# Altium schematic symbol library IC_TI.SCHLIB: 1162 symbols (part 6 of 8) (continued)
## TL082ACP (continued)
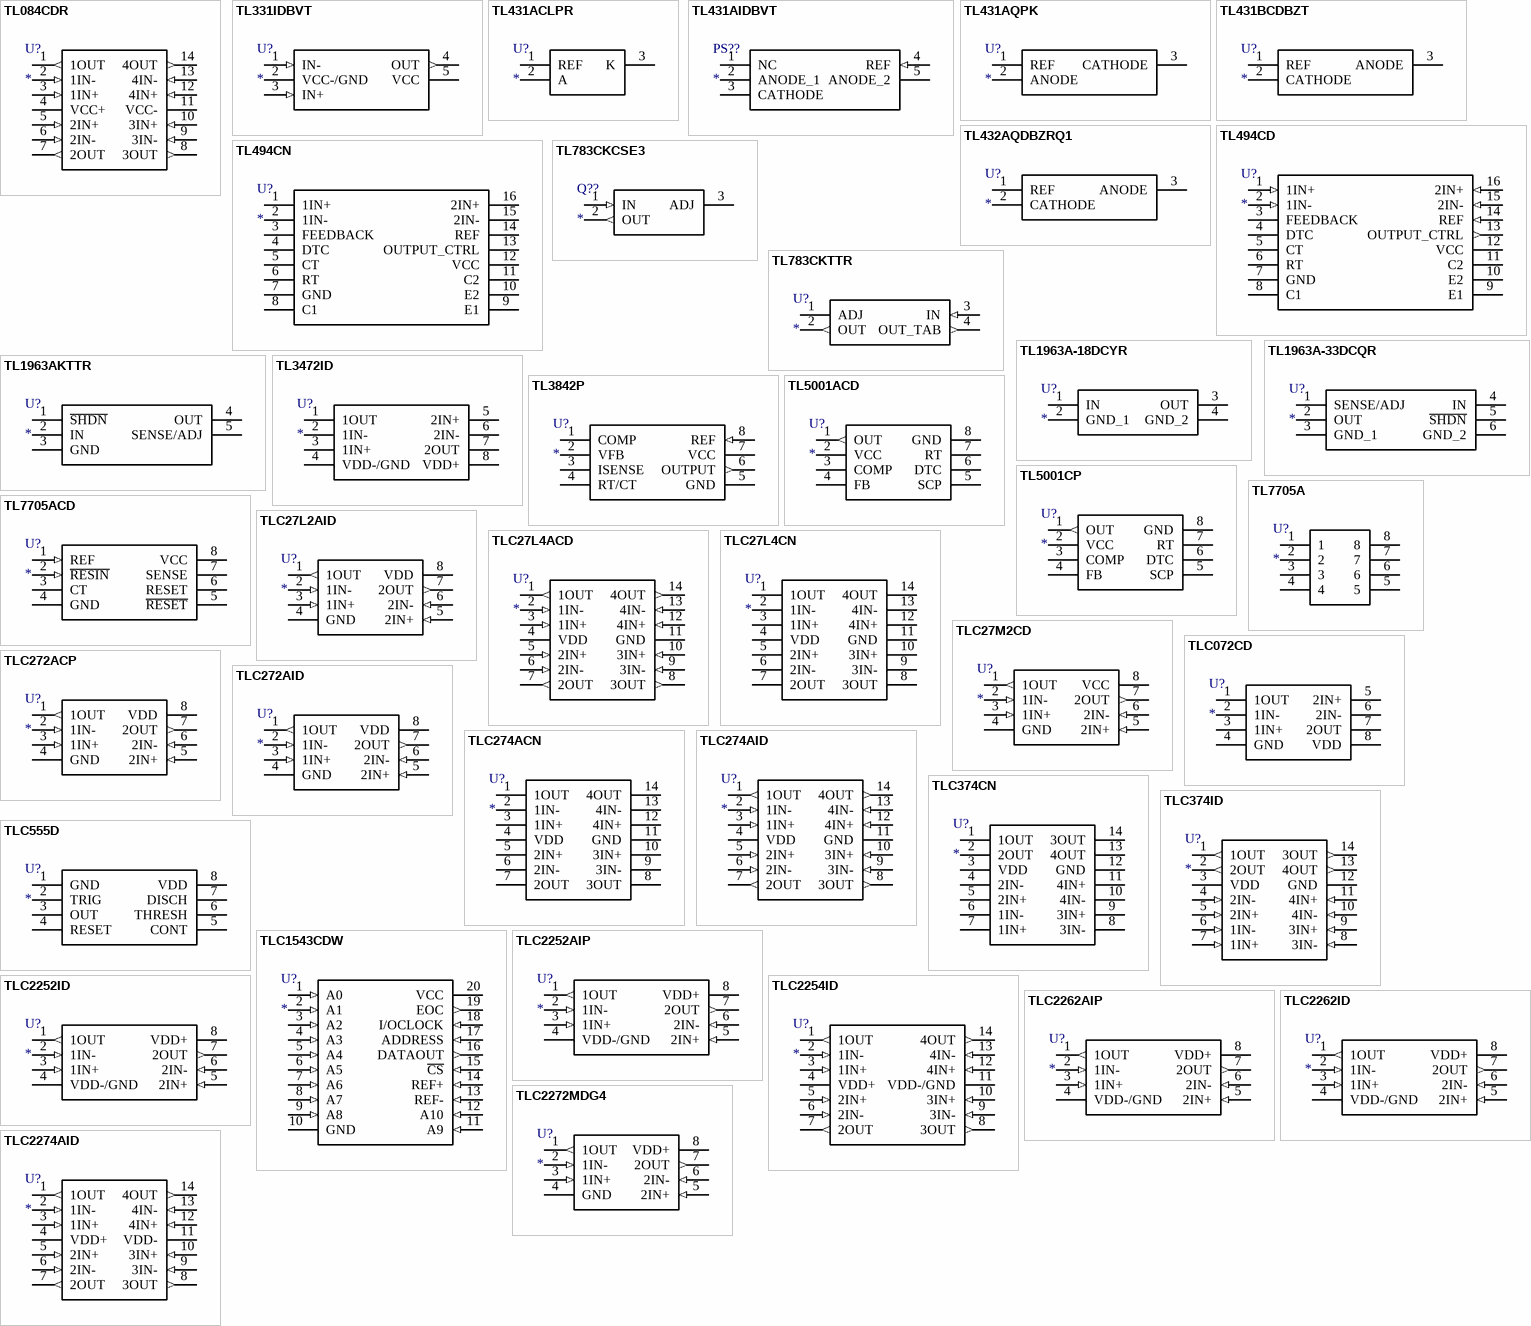
[diagram p26: symbols TL084CDR to TLC2274AID]

## TL084CDR
designator U?
Integrated Circuit; Manufacturer_Name: Texas Instruments; Manufacturer_Part_Number: TL084CDR; Datasheet Link: http://www.ti.com/lit/ds/symlink/tl084.pdf; Height: 1.75mm; Mouser Part Number: 595-TL084CDR; Mouser Price/Stock: https://www.mouser.com/Search/Refine.aspx?Keyword=595-TL084CDR; RS Part Number: 1788945; RS Price/Stock: http://uk.rs-online.com/web/p/products/1788945
footprint SOIC14_1.27
pins: 1 1OUT (out), 2 1IN- (in), 3 1IN+ (in), 4 VCC+ (power), 5 2IN+ (in), 6 2IN- (in), 7 2OUT (out), 8 3OUT (out), 9 3IN- (in), 10 3IN+ (in), 11 VCC- (power), 12 4IN+ (in), 13 4IN- (in), 14 4OUT (out)

## TL331IDBVT
designator U?
Integrated Circuit; Manufacturer_Name: Texas Instruments; Manufacturer_Part_Number: TL331IDBVT; Datasheet Link: http://www.ti.com/lit/ds/symlink/tl331.pdf; Height: 1.45mm; Mouser Part Number: 595-TL331IDBVT; Mouser Price/Stock: https://www.mouser.com/Search/Refine.aspx?Keyword=595-TL331IDBVT; RS Part Number: 6607446; RS Price/Stock: http://uk.rs-online.com/web/p/products/6607446
footprint SOT23-5 (SOT23, 5-Leads, Body 3.0x3.0mm (max), Pitch 0.95mm, IPC Medium Density)
pins: 1 IN- (in), 2 VCC-/GND (power), 3 IN+ (in), 4 OUT (out), 5 VCC (power)

## TL431ACLPR
designator U?
Integrated Circuit; Manufacturer_Name: Texas Instruments; Manufacturer_Part_Number: TL431ACLPR; Datasheet Link: http://www.ti.com/lit/gpn/tl431; Height: 5.34mm; Mouser Part Number: 595-TL431ACLPR; Mouser Price/Stock: https://www.mouser.com/Search/Refine.aspx?Keyword=595-TL431ACLPR; RS Part Number: 1686332; RS Price/Stock: http://uk.rs-online.com/web/p/products/1686332
footprint TO92 Bent
pins: 1 REF, 2 A, 3 K

## TL431AIDBVT
designator PS??
Power Supply; Manufacturer_Name: Texas Instruments; Manufacturer_Part_Number: TL431AIDBVT; Datasheet Link: http://www.ti.com/lit/gpn/tl431a; Height: 1.45mm; Mouser Part Number: 595-TL431AIDBVT; Mouser Price/Stock: https://www.mouser.com/Search/Refine.aspx?Keyword=595-TL431AIDBVT; RS Part Number: 6619515P; RS Price/Stock: http://uk.rs-online.com/web/p/products/6619515P
footprint SOT23-5 (SOT23, 5-Leads, Body 3.0x3.0mm (max), Pitch 0.95mm, IPC Medium Density)
pins: 1 NC, 2 ANODE_1 (power), 3 CATHODE (power), 4 REF (in), 5 ANODE_2 (power)

## TL431AQPK
designator U?
Integrated Circuit; Manufacturer_Name: Texas Instruments; Manufacturer_Part_Number: TL431AQPK; Datasheet Link: http://www.ti.com/lit/gpn/tl431a; Mouser Part Number: 595-TL431AQPK; Mouser Price/Stock: https://www.mouser.com/Search/Refine.aspx?Keyword=595-TL431AQPK
footprint sot89
pins: 1 REF, 2 ANODE, 3 CATHODE

## TL431BCDBZT
designator U?
Integrated Circuit; Manufacturer_Name: Texas Instruments; Manufacturer_Part_Number: TL431BCDBZT; Datasheet Link: http://www.ti.com/lit/ds/symlink/tl431b.pdf; Height: 1.12mm; Mouser Part Number: 595-TL431BCDBZT; Mouser Price/Stock: https://www.mouser.com/Search/Refine.aspx?Keyword=595-TL431BCDBZT; RS Part Number: 1456891; RS Price/Stock: http://uk.rs-online.com/web/p/products/1456891
footprint SOT23-3 (贴片MOS的SOT-23封装)
pins: 1 REF, 2 CATHODE, 3 ANODE

## TL432AQDBZRQ1
designator U?
Integrated Circuit; Manufacturer_Name: Texas Instruments; Manufacturer_Part_Number: TL432AQDBZRQ1; Datasheet Link: http://componentsearchengine.com/Datasheets/1/TL432AQDBZRQ1.pdf; Mouser Part Number: 595-TL432AQDBZRQ1; Mouser Price/Stock: https://www.mouser.com/Search/Refine.aspx?Keyword=595-TL432AQDBZRQ1
footprint SOT23-3 (贴片MOS的SOT-23封装)
pins: 1 REF, 2 CATHODE, 3 ANODE

## TL494CD
designator U?
Integrated Circuit; Manufacturer_Name: Texas Instruments; Manufacturer_Part_Number: TL494CD; Datasheet Link: http://www.ti.com/lit/ds/symlink/tl494.pdf; Height: 1.75mm; Mouser Part Number: 595-TL494CD; Mouser Price/Stock: https://www.mouser.com/Search/Refine.aspx?Keyword=595-TL494CD; RS Part Number: 6614958P; RS Price/Stock: http://uk.rs-online.com/web/p/products/6614958P
footprint SOIC16_1.27
pins: 1 1IN+ (in), 2 1IN- (in), 3 FEEDBACK, 4 DTC, 5 CT, 6 RT, 7 GND (power), 8 C1, 9 E1, 10 E2, 11 C2, 12 VCC (power), 13 OUTPUT_CTRL (out), 14 REF (in), 15 2IN- (in), 16 2IN+ (in)

## TL494CN
designator U?
Integrated Circuit; Manufacturer_Name: Texas Instruments; Manufacturer_Part_Number: TL494CN; Datasheet Link: http://www.ti.com/lit/gpn/tl494; Mouser Part Number: 595-TL494CN; Mouser Price/Stock: https://www.mouser.com/Search/Refine.aspx?Keyword=595-TL494CN; RS Part Number: 0528123; RS Price/Stock: http://uk.rs-online.com/web/p/products/0528123
footprint DIP16
pins: 1 1IN+, 2 1IN-, 3 FEEDBACK, 4 DTC, 5 CT, 6 RT, 7 GND, 8 C1, 9 E1, 10 E2, 11 C2, 12 VCC, 13 OUTPUT_CTRL, 14 REF, 15 2IN-, 16 2IN+

## TL783CKCSE3
designator Q??
Transistor; Manufacturer_Name: Texas Instruments; Manufacturer_Part_Number: TL783CKCSE3; Datasheet Link: http://uk.rs-online.com/web/p/products/6616232; Height: 4.7mm; Mouser Part Number: 595-TL783CKCSE3; Mouser Price/Stock: https://www.mouser.com/Search/Refine.aspx?Keyword=595-TL783CKCSE3; RS Part Number: 9223508; RS Price/Stock: http://uk.rs-online.com/web/p/products/9223508
footprint TO220-3
pins: 1 IN (in), 2 OUT (out), 3 ADJ

## TL783CKTTR
designator U?
Integrated Circuit; Manufacturer_Name: Texas Instruments; Manufacturer_Part_Number: TL783CKTTR; Datasheet Link: http://www.ti.com/lit/ds/symlink/tl783.pdf; Height: 4.83mm; Mouser Part Number: 595-TL783CKTTR; Mouser Price/Stock: https://www.mouser.com/Search/Refine.aspx?Keyword=595-TL783CKTTR; RS Part Number: 1219058; RS Price/Stock: http://uk.rs-online.com/web/p/products/1219058
footprint TO263-3
pins: 1 ADJ, 2 OUT (out), 3 IN (in), 4 OUT_TAB (out)

## TL1963A-18DCYR
designator U?
Integrated Circuit; Manufacturer_Name: Texas Instruments; Manufacturer_Part_Number: TL1963A-18DCYR; Datasheet Link: http://www.ti.com/lit/gpn/tl1963a; Height: 1.8mm; Mouser Part Number: 595-TL1963A-18DCYR; Mouser Price/Stock: https://www.mouser.com/Search/Refine.aspx?Keyword=595-TL1963A-18DCYR
footprint SOT223
pins: 1 IN, 2 GND_1, 3 OUT, 4 GND_2

## TL1963A-33DCQR
designator U?
Integrated Circuit; Manufacturer_Name: Texas Instruments; Manufacturer_Part_Number: TL1963A-33DCQR; Datasheet Link: http://www.ti.com/lit/gpn/tl1963a; Height: 1.8mm; Mouser Part Number: 595-TL1963A-33DCQR; Mouser Price/Stock: https://www.mouser.com/Search/Refine.aspx?Keyword=595-TL1963A-33DCQR
footprint SOT223-6
pins: 1 SENSE/ADJ, 2 OUT, 3 GND_1, 4 IN, 5 ~{SHDN}, 6 GND_2

## TL1963AKTTR
designator U?
Integrated Circuit; Manufacturer_Name: Texas Instruments; Manufacturer_Part_Number: TL1963AKTTR; Datasheet Link: http://www.ti.com/lit/gpn/tl1963a; Mouser Part Number: 595-TL1963AKTTR; Mouser Price/Stock: https://www.mouser.com/Search/Refine.aspx?Keyword=595-TL1963AKTTR; RS Part Number: 1629864; RS Price/Stock: http://uk.rs-online.com/web/p/products/1629864
footprint TO263-5
pins: 1 ~{SHDN}, 2 IN, 3 GND, 4 OUT, 5 SENSE/ADJ

## TL3472ID
designator U?
Integrated Circuit; Manufacturer_Name: Texas Instruments; Manufacturer_Part_Number: TL3472ID; Mouser Part Number: 595-TL3472ID; Mouser Price/Stock: https://www.mouser.com/Search/Refine.aspx?Keyword=595-TL3472ID
footprint SOIC8_1.27 (SOP, 8-Leads, Pitch 1.27mm)
pins: 1 1OUT, 2 1IN-, 3 1IN+, 4 VDD-/GND, 5 2IN+, 6 2IN-, 7 2OUT, 8 VDD+

## TL3842P
designator U?
Integrated Circuit; Manufacturer_Name: Texas Instruments; Manufacturer_Part_Number: TL3842P; Datasheet Link: http://www.ti.com/lit/ds/symlink/tl3842.pdf; Height: 5.08mm; Mouser Part Number: 595-TL3842P; Mouser Price/Stock: https://www.mouser.com/Search/Refine.aspx?Keyword=595-TL3842P; RS Part Number: 1450123; RS Price/Stock: http://uk.rs-online.com/web/p/products/1450123
footprint DIP8-A
pins: 1 COMP, 2 VFB, 3 ISENSE, 4 RT/CT, 5 GND (power), 6 OUTPUT (out), 7 VCC (power), 8 REF (in)

## TL5001ACD
designator U?
Integrated Circuit; Manufacturer_Name: Texas Instruments; Manufacturer_Part_Number: TL5001ACD; Datasheet Link: http://www.ti.com/lit/ds/symlink/tl5001a.pdf; Height: 1.75mm; Mouser Part Number: 595-TL5001ACD; Mouser Price/Stock: https://www.mouser.com/Search/Refine.aspx?Keyword=595-TL5001ACD; RS Part Number: 1624865; RS Price/Stock: http://uk.rs-online.com/web/p/products/1624865
footprint SOIC8_1.27 (SOP, 8-Leads, Pitch 1.27mm)
pins: 1 OUT (out), 2 VCC (power), 3 COMP, 4 FB, 5 SCP, 6 DTC, 7 RT, 8 GND (power)

## TL5001CP
designator U?
Integrated Circuit; Manufacturer_Name: Texas Instruments; Manufacturer_Part_Number: TL5001CP; Datasheet Link: http://www.ti.com/lit/ds/symlink/tl5001.pdf; Height: 5.08mm; Mouser Part Number: 595-TL5001CP; Mouser Price/Stock: https://www.mouser.com/Search/Refine.aspx?Keyword=595-TL5001CP; RS Part Number: 1624341; RS Price/Stock: http://uk.rs-online.com/web/p/products/1624341
footprint DIP8-A
pins: 1 OUT (out), 2 VCC (power), 3 COMP, 4 FB, 5 SCP, 6 DTC, 7 RT, 8 GND (power)

## TL7705A
designator U?
Integrated Circuit; Manufacturer_Name: Texas Instruments; Manufacturer_Part_Number: TL7705A; Datasheet Link: http://www.ti.com/product/TL7705A; Height: 5.08mm
footprint DIP8-A
pins: 1, 2, 3, 4, 5, 6, 7, 8

## TL7705ACD
designator U?
Integrated Circuit; Manufacturer_Name: Texas Instruments; Manufacturer_Part_Number: TL7705ACD; Datasheet Link: http://www.ti.com/lit/ds/symlink/tl7705a.pdf; Height: 1.75mm; Mouser Part Number: 595-TL7705ACD; Mouser Price/Stock: https://www.mouser.com/Search/Refine.aspx?Keyword=595-TL7705ACD; RS Part Number: 6624832P; RS Price/Stock: http://uk.rs-online.com/web/p/products/6624832P
footprint SOIC8_1.27 (SOP, 8-Leads, Pitch 1.27mm)
pins: 1 REF (in), 2 ~{RESIN} (in), 3 CT, 4 GND (power), 5 ~{RESET}, 6 RESET, 7 SENSE, 8 VCC (power)

## TLC27L2AID
designator U?
Integrated Circuit; Manufacturer_Name: Texas Instruments; Manufacturer_Part_Number: TLC27L2AID; Datasheet Link: http://www.ti.com/lit/ds/symlink/tlc27l2a.pdf; Height: 1.75mm; RS Part Number: 1624868; RS Price/Stock: http://uk.rs-online.com/web/p/products/1624868
footprint SOIC8_1.27 (SOP, 8-Leads, Pitch 1.27mm)
pins: 1 1OUT (out), 2 1IN- (in), 3 1IN+ (in), 4 GND (power), 5 2IN+ (in), 6 2IN- (in), 7 2OUT (out), 8 VDD (power)

## TLC27L4ACD
designator U?
Integrated Circuit; Manufacturer_Name: Texas Instruments; Manufacturer_Part_Number: TLC27L4ACD; Datasheet Link: http://docs-emea.rs-online.com/webdocs/0026/0900766b80026a30.pdf; Height: 1.75mm; RS Part Number: 1455723; RS Price/Stock: http://uk.rs-online.com/web/p/products/1455723
footprint SOIC14_1.27
pins: 1 1OUT (out), 2 1IN- (in), 3 1IN+ (in), 4 VDD (power), 5 2IN+ (in), 6 2IN- (in), 7 2OUT (out), 8 3OUT (out), 9 3IN- (in), 10 3IN+ (in), 11 GND (power), 12 4IN+ (in), 13 4IN- (in), 14 4OUT (out)

## TLC27L4CN
designator U?
Integrated Circuit; Manufacturer_Name: Texas Instruments; Manufacturer_Part_Number: TLC27L4CN; Datasheet Link: http://www.ti.com/lit/gpn/tlc27l4; Mouser Part Number: 595-TLC27L4CN; Mouser Price/Stock: https://www.mouser.com/Search/Refine.aspx?Keyword=595-TLC27L4CN; RS Part Number: 1268796A; RS Price/Stock: http://uk.rs-online.com/web/p/products/1268796A
footprint DIP14
pins: 1 1OUT, 2 1IN-, 3 1IN+, 4 VDD, 5 2IN+, 6 2IN-, 7 2OUT, 8 3OUT, 9 3IN-, 10 3IN+, 11 GND, 12 4IN+, 13 4IN-, 14 4OUT

## TLC27M2CD
designator U?
Integrated Circuit; Manufacturer_Name: Texas Instruments; Manufacturer_Part_Number: TLC27M2CD; Datasheet Link: http://www.ti.com/lit/ds/symlink/tlc27m2.pdf; Height: 1.75mm; Mouser Part Number: 595-TLC27M2CD; Mouser Price/Stock: https://www.mouser.com/Search/ProductDetail.aspx?qs=VuX40u8tcuArKB%252blaUPdBw%3d%3d; RS Part Number: 6611785; RS Price/Stock: http://uk.rs-online.com/web/p/operational-amplifiers/6611785/?source=DS
footprint SOIC8_1.27 (SOP, 8-Leads, Pitch 1.27mm)
pins: 1 1OUT (out), 2 1IN- (in), 3 1IN+ (in), 4 GND (power), 5 2IN+ (in), 6 2IN- (in), 7 2OUT (out), 8 VCC (power)

## TLC072CD
designator U?
Integrated Circuit; Manufacturer_Name: Texas Instruments; Manufacturer_Part_Number: TLC072CD; Mouser Part Number: 595-TLC072CD; Mouser Price/Stock: https://www.mouser.com/Search/Refine.aspx?Keyword=595-TLC072CD; RS Part Number: 6611435P; RS Price/Stock: http://uk.rs-online.com/web/p/products/6611435P
footprint SOIC8_1.27 (SOP, 8-Leads, Pitch 1.27mm)
pins: 1 1OUT, 2 1IN-, 3 1IN+, 4 GND, 5 2IN+, 6 2IN-, 7 2OUT, 8 VDD

## TLC272ACP
designator U?
Integrated Circuit; Manufacturer_Name: Texas Instruments; Manufacturer_Part_Number: TLC272ACP; Datasheet Link: http://www.ti.com/lit/ds/symlink/tlc272a.pdf; Height: 5.08mm; Mouser Part Number: 595-TLC272ACP; Mouser Price/Stock: https://www.mouser.com/Search/Refine.aspx?Keyword=595-TLC272ACP; RS Part Number: 1792089; RS Price/Stock: http://uk.rs-online.com/web/p/products/1792089
footprint DIP8-A
pins: 1 1OUT (out), 2 1IN- (in), 3 1IN+ (in), 4 GND (power), 5 2IN+ (in), 6 2IN- (in), 7 2OUT (out), 8 VDD (power)

## TLC272AID
designator U?
Integrated Circuit; Manufacturer_Name: Texas Instruments; Manufacturer_Part_Number: TLC272AID; Datasheet Link: http://www.ti.com/lit/ds/symlink/tlc272a.pdf; Height: 1.75mm; Mouser Part Number: 595-TLC272AID; Mouser Price/Stock: https://www.mouser.com/Search/Refine.aspx?Keyword=595-TLC272AID; RS Part Number: 4621566P; RS Price/Stock: http://uk.rs-online.com/web/p/products/4621566P
footprint SOIC8_1.27 (SOP, 8-Leads, Pitch 1.27mm)
pins: 1 1OUT (out), 2 1IN- (in), 3 1IN+ (in), 4 GND (power), 5 2IN+ (in), 6 2IN- (in), 7 2OUT (out), 8 VDD (power)

## TLC274ACN
designator U?
Integrated Circuit; Manufacturer_Name: Texas Instruments; Manufacturer_Part_Number: TLC274ACN; Datasheet Link: http://www.ti.com/lit/gpn/tlc274a; Height: 5.08mm; Mouser Part Number: 595-TLC274ACN; RS Part Number: 2508712161; RS Price/Stock: http://uk.rs-online.com/web/p/products/2508712161
footprint DIP14-A
pins: 1 1OUT, 2 1IN-, 3 1IN+, 4 VDD, 5 2IN+, 6 2IN-, 7 2OUT, 8 3OUT, 9 3IN-, 10 3IN+, 11 GND, 12 4IN+, 13 4IN-, 14 4OUT

## TLC274AID
designator U?
Integrated Circuit; Manufacturer_Name: Texas Instruments; Manufacturer_Part_Number: TLC274AID; Datasheet Link: http://www.ti.com/lit/ds/symlink/tlc274a.pdf; Height: 1.75mm; RS Part Number: 4621588; RS Price/Stock: http://uk.rs-online.com/web/p/products/4621588
footprint SOIC14_1.27
pins: 1 1OUT (out), 2 1IN- (in), 3 1IN+ (in), 4 VDD (power), 5 2IN+ (in), 6 2IN- (in), 7 2OUT (out), 8 3OUT (out), 9 3IN- (in), 10 3IN+ (in), 11 GND (power), 12 4IN+ (in), 13 4IN- (in), 14 4OUT (out)

## TLC374CN
designator U?
Integrated Circuit; Manufacturer_Name: Texas Instruments; Manufacturer_Part_Number: TLC374CN; Datasheet Link: http://www.ti.com/lit/gpn/tlc374; Mouser Part Number: 595-TLC374CN; Mouser Price/Stock: https://www.mouser.com/Search/Refine.aspx?Keyword=595-TLC374CN; RS Part Number: 1624362; RS Price/Stock: http://uk.rs-online.com/web/p/products/1624362
footprint DIP14
pins: 1 1OUT, 2 2OUT, 3 VDD, 4 2IN-, 5 2IN+, 6 1IN-, 7 1IN+, 8 3IN-, 9 3IN+, 10 4IN-, 11 4IN+, 12 GND, 13 4OUT, 14 3OUT

## TLC374ID
designator U?
Integrated Circuit; Manufacturer_Name: Texas Instruments; Manufacturer_Part_Number: TLC374ID; Datasheet Link: http://www.ti.com/lit/ds/symlink/tlc374.pdf; Height: 1.75mm; Mouser Part Number: 595-TLC374ID; Mouser Price/Stock: https://www.mouser.com/Search/Refine.aspx?Keyword=595-TLC374ID; RS Part Number: 3569754P; RS Price/Stock: http://uk.rs-online.com/web/p/products/3569754P
footprint SOIC14_1.27
pins: 1 1OUT (out), 2 2OUT (out), 3 VDD (power), 4 2IN- (in), 5 2IN+ (in), 6 1IN- (in), 7 1IN+ (in), 8 3IN- (in), 9 3IN+ (in), 10 4IN- (in), 11 4IN+ (in), 12 GND (power), 13 4OUT (out), 14 3OUT (out)

## TLC555D
designator U?
Integrated Circuit; Manufacturer_Name: Texas Instruments; Manufacturer_Part_Number: TLC555D; Datasheet Link: http://www.ti.com/general/docs/lit/getliterature.tsp?genericPartNumber=tlc555&fileType=pdf; Height: 1.75mm
footprint SOIC8_1.27 (SOP, 8-Leads, Pitch 1.27mm)
pins: 1 GND, 2 TRIG, 3 OUT, 4 RESET, 5 CONT, 6 THRESH, 7 DISCH, 8 VDD

## TLC1543CDW
designator U?
Integrated Circuit; Manufacturer_Name: Texas Instruments; Manufacturer_Part_Number: TLC1543CDW; Datasheet Link: http://docs-emea.rs-online.com/webdocs/0c92/0900766b80c92317.pdf; Height: 2.65mm; Mouser Part Number: 595-TLC1543CDW; Mouser Price/Stock: https://www.mouser.com/Search/Refine.aspx?Keyword=595-TLC1543CDW; RS Part Number: 6620221P; RS Price/Stock: http://uk.rs-online.com/web/p/products/6620221P
footprint SOIC20W_1.27
pins: 1 A0 (in), 2 A1 (in), 3 A2 (in), 4 A3 (in), 5 A4 (in), 6 A5 (in), 7 A6 (in), 8 A7 (in), 9 A8 (in), 10 GND (power), 11 A9 (in), 12 A10 (in), 13 REF- (in), 14 REF+ (in), 15 ~{CS} (in), 16 DATAOUT (out), 17 ADDRESS (in), 18 I/OCLOCK (in), 19 EOC (out), 20 VCC (power)

## TLC2252AIP
designator U?
Integrated Circuit; Manufacturer_Name: Texas Instruments; Manufacturer_Part_Number: TLC2252AIP; Datasheet Link: http://www.ti.com/lit/ds/symlink/tlc2252a.pdf; Height: 5.08mm; RS Part Number: 1455933; RS Price/Stock: http://uk.rs-online.com/web/p/products/1455933
footprint DIP8-A
pins: 1 1OUT (out), 2 1IN- (in), 3 1IN+ (in), 4 VDD-/GND (power), 5 2IN+ (in), 6 2IN- (in), 7 2OUT (out), 8 VDD+ (power)

## TLC2252ID
designator U?
Integrated Circuit; Manufacturer_Name: Texas Instruments; Manufacturer_Part_Number: TLC2252ID; Datasheet Link: http://www.ti.com/lit/ds/symlink/tlc2252.pdf; Height: 1.75mm; Mouser Part Number: 595-TLC2252ID; Mouser Price/Stock: https://www.mouser.com/Search/Refine.aspx?Keyword=595-TLC2252ID; RS Part Number: 3569495P; RS Price/Stock: http://uk.rs-online.com/web/p/products/3569495P
footprint SOIC8_1.27 (SOP, 8-Leads, Pitch 1.27mm)
pins: 1 1OUT (out), 2 1IN- (in), 3 1IN+ (in), 4 VDD-/GND (power), 5 2IN+ (in), 6 2IN- (in), 7 2OUT (out), 8 VDD+ (power)

## TLC2254ID
designator U?
Integrated Circuit; Manufacturer_Name: Texas Instruments; Manufacturer_Part_Number: TLC2254ID; Datasheet Link: http://www.ti.com/lit/ds/symlink/tlc2254.pdf; Height: 1.75mm; Mouser Part Number: 595-TLC2254ID; Mouser Price/Stock: https://www.mouser.com/Search/Refine.aspx?Keyword=595-TLC2254ID; RS Part Number: 3569502; RS Price/Stock: http://uk.rs-online.com/web/p/products/3569502
footprint SOIC14_1.27
pins: 1 1OUT (out), 2 1IN- (in), 3 1IN+ (in), 4 VDD+ (power), 5 2IN+ (in), 6 2IN- (in), 7 2OUT (out), 8 3OUT (out), 9 3IN- (in), 10 3IN+ (in), 11 VDD-/GND (power), 12 4IN+ (in), 13 4IN- (in), 14 4OUT (out)

## TLC2262AIP
designator U?
Integrated Circuit; Manufacturer_Name: Texas Instruments; Manufacturer_Part_Number: TLC2262AIP; Datasheet Link: http://www.ti.com/lit/ds/symlink/tlc2262a.pdf; Height: 5.08mm; Mouser Part Number: 595-TLC2262AIP; Mouser Price/Stock: https://www.mouser.com/Search/Refine.aspx?Keyword=595-TLC2262AIP; RS Part Number: 6611530P; RS Price/Stock: http://uk.rs-online.com/web/p/products/6611530P
footprint DIP8-A
pins: 1 1OUT (out), 2 1IN- (in), 3 1IN+ (in), 4 VDD-/GND (power), 5 2IN+ (in), 6 2IN- (in), 7 2OUT (out), 8 VDD+ (power)

## TLC2262ID
designator U?
Integrated Circuit; Manufacturer_Name: Texas Instruments; Manufacturer_Part_Number: TLC2262ID; Datasheet Link: http://www.ti.com/lit/ds/symlink/tlc2262.pdf; Height: 1.75mm; Mouser Part Number: 595-TLC2262ID; Mouser Price/Stock: https://www.mouser.com/Search/Refine.aspx?Keyword=595-TLC2262ID; RS Part Number: 3569518; RS Price/Stock: http://uk.rs-online.com/web/p/products/3569518
footprint SOIC8_1.27 (SOP, 8-Leads, Pitch 1.27mm)
pins: 1 1OUT (out), 2 1IN- (in), 3 1IN+ (in), 4 VDD-/GND (power), 5 2IN+ (in), 6 2IN- (in), 7 2OUT (out), 8 VDD+ (power)

## TLC2272MDG4
designator U?
Integrated Circuit; Manufacturer_Name: Texas Instruments; Manufacturer_Part_Number: TLC2272MDG4; Datasheet Link: http://www.ti.com/lit/gpn/tlc2272m; Height: 1.75mm; Mouser Part Number: 595-TLC2272MDG4; Mouser Price/Stock: https://www.mouser.com/Search/Refine.aspx?Keyword=595-TLC2272MDG4
footprint SOIC8_1.27 (SOP, 8-Leads, Pitch 1.27mm)
pins: 1 1OUT (out), 2 1IN- (in), 3 1IN+ (in), 4 GND (power), 5 2IN+ (in), 6 2IN- (in), 7 2OUT (out), 8 VDD+ (power)

## TLC2274AID
designator U?
Integrated Circuit; Manufacturer_Name: Texas Instruments; Manufacturer_Part_Number: TLC2274AID; Datasheet Link: http://www.ti.com/lit/ds/symlink/tlc2274a.pdf; Height: 1.75mm; Mouser Part Number: 595-TLC2274AID; Mouser Price/Stock: https://www.mouser.com/Search/Refine.aspx?Keyword=595-TLC2274AID; RS Part Number: 1792064; RS Price/Stock: http://uk.rs-online.com/web/p/products/1792064
footprint SOIC14_1.27
pins: 1 1OUT (out), 2 1IN- (in), 3 1IN+ (in), 4 VDD+ (power), 5 2IN+ (in), 6 2IN- (in), 7 2OUT (out), 8 3OUT (out), 9 3IN- (in), 10 3IN+ (in), 11 VDD- (power), 12 4IN+ (in), 13 4IN- (in), 14 4OUT (out)

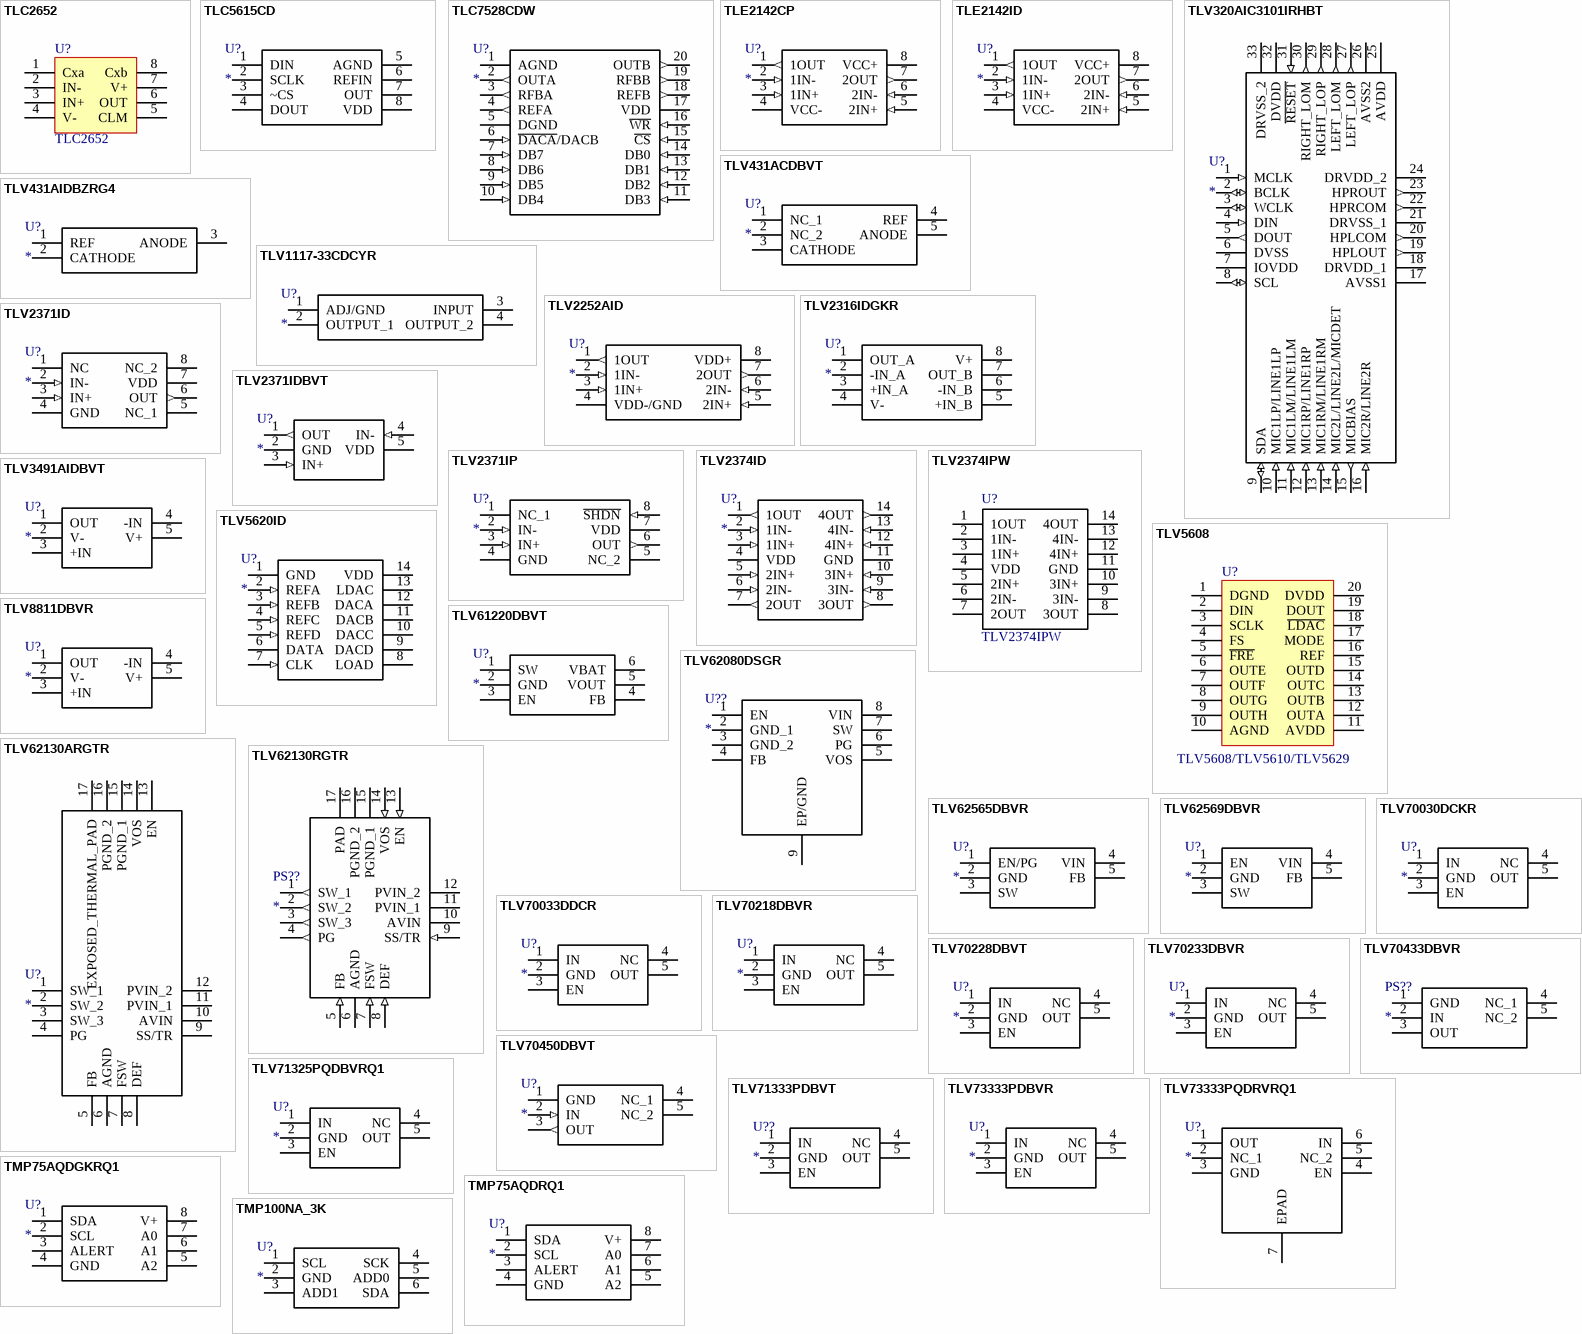
[diagram p27: symbols TLC2652 to TMP100NA_3K]

## TLC2652
designator U?
footprint SOIC8_1.27 (SOP, 8-Leads, Pitch 1.27mm)
pins: 1 Cxa, 2 IN-, 3 IN+, 4 V-, 5 CLM, 6 OUT, 7 V+, 8 Cxb

## TLC5615CD
designator U?
Integrated Circuit; Manufacturer_Name: Texas Instruments; Manufacturer_Part_Number: TLC5615CD; Datasheet Link: http://www.ti.com/lit/gpn/tlc5615; Mouser Part Number: 595-TLC5615CD; Mouser Price/Stock: https://www.mouser.com/Search/Refine.aspx?Keyword=595-TLC5615CD; RS Part Number: 6200379; RS Price/Stock: http://uk.rs-online.com/web/p/products/6200379
footprint SOIC8_1.27 (SOP, 8-Leads, Pitch 1.27mm)
pins: 1 DIN, 2 SCLK, 3 ~CS, 4 DOUT, 5 AGND, 6 REFIN, 7 OUT, 8 VDD

## TLC7528CDW
designator U?
Integrated Circuit; Manufacturer_Name: Texas Instruments; Manufacturer_Part_Number: TLC7528CDW; Datasheet Link: http://www.ti.com/lit/ds/symlink/tlc7528.pdf; Height: 2.65mm; Mouser Part Number: 595-TLC7528CDW; Mouser Price/Stock: https://www.mouser.com/Search/Refine.aspx?Keyword=595-TLC7528CDW; RS Part Number: 1455716; RS Price/Stock: http://uk.rs-online.com/web/p/products/1455716
footprint SOIC20W_1.27
pins: 1 AGND (power), 2 OUTA (out), 3 RFBA (out), 4 REFA (out), 5 DGND (power), 6 ~{DACA}/DACB (in), 7 DB7 (in), 8 DB6 (in), 9 DB5 (in), 10 DB4 (in), 11 DB3 (in), 12 DB2 (in), 13 DB1 (in), 14 DB0 (in), 15 ~{CS} (in), 16 ~{WR} (in), 17 VDD (power), 18 REFB (out), 19 RFBB (out), 20 OUTB (out)

## TLE2142CP
designator U?
Integrated Circuit; Manufacturer_Name: Texas Instruments; Manufacturer_Part_Number: TLE2142CP; Datasheet Link: http://www.ti.com/lit/ds/symlink/tle2141a.pdf; Height: 5.08mm; Mouser Part Number: 595-TLE2142CP; Mouser Price/Stock: https://www.mouser.com/Search/Refine.aspx?Keyword=595-TLE2142CP; RS Part Number: 6612025P; RS Price/Stock: http://uk.rs-online.com/web/p/products/6612025P
footprint DIP8-A
pins: 1 1OUT (out), 2 1IN- (in), 3 1IN+ (in), 4 VCC- (power), 5 2IN+ (in), 6 2IN- (in), 7 2OUT (out), 8 VCC+ (power)

## TLE2142ID
designator U?
Integrated Circuit; Manufacturer_Name: Texas Instruments; Manufacturer_Part_Number: TLE2142ID; Datasheet Link: http://www.ti.com/lit/ds/symlink/tle2142.pdf; Height: 1.75mm; Mouser Part Number: 595-TLE2142ID; Mouser Price/Stock: https://www.mouser.com/Search/Refine.aspx?Keyword=595-TLE2142ID; RS Part Number: 3570158; RS Price/Stock: http://uk.rs-online.com/web/p/products/3570158
footprint SOIC8_1.27 (SOP, 8-Leads, Pitch 1.27mm)
pins: 1 1OUT (out), 2 1IN- (in), 3 1IN+ (in), 4 VCC- (power), 5 2IN+ (in), 6 2IN- (in), 7 2OUT (out), 8 VCC+ (power)

## TLV320AIC3101IRHBT
designator U?
Integrated Circuit; Manufacturer_Name: Texas Instruments; Manufacturer_Part_Number: TLV320AIC3101IRHBT; Datasheet Link: http://www.ti.com/lit/gpn/tlv320aic3101; Height: 1mm; Mouser Part Number: 595-T320AIC3101IRHBT; Mouser Price/Stock: https://www.mouser.com/Search/Refine.aspx?Keyword=595-T320AIC3101IRHBT; RS Part Number: 1627847; RS Price/Stock: http://uk.rs-online.com/web/p/products/1627847
footprint QFN32_0.5-PAD(5X5) (QFN, 32-Leads, Body 5.2x5.2mm (max), Pitch 0.50mm, IPC Medium Density)
pins: 1 MCLK (in), 2 BCLK (io), 3 WCLK (io), 4 DIN (in), 5 DOUT (out), 6 DVSS (power), 7 IOVDD (power), 8 SCL (io), 9 SDA (io), 10 MIC1LP/LINE1LP (in), 11 MIC1LM/LINE1LM (in), 12 MIC1RP/LINE1RP (in), 13 MIC1RM/LINE1RM (in), 14 MIC2L/LINE2L/MICDET (in), 15 MICBIAS (out), 16 MIC2R/LINE2R (in), 17 AVSS1 (power), 18 DRVDD_1 (power), 19 HPLOUT (out), 20 HPLCOM (out), 21 DRVSS_1 (power), 22 HPRCOM (out), 23 HPROUT (out), 24 DRVDD_2 (power), 25 AVDD (power), 26 AVSS2 (power), 27 LEFT_LOP (out), 28 LEFT_LOM (out), 29 RIGHT_LOP (out), 30 RIGHT_LOM (out), 31 ~{RESET} (in), 32 DVDD (power), 33 DRVSS_2 (power)

## TLV431ACDBVT
designator U?
Integrated Circuit; Manufacturer_Name: Texas Instruments; Manufacturer_Part_Number: TLV431ACDBVT; Datasheet Link: http://uk.rs-online.com/web/p/products/1457357; Height: 1.45mm; Mouser Part Number: 595-TLV431ACDBVT; Mouser Price/Stock: https://www.mouser.com/Search/Refine.aspx?Keyword=595-TLV431ACDBVT; RS Part Number: 1457357; RS Price/Stock: http://uk.rs-online.com/web/p/products/1457357
footprint SOT23-5 (SOT23, 5-Leads, Body 3.0x3.0mm (max), Pitch 0.95mm, IPC Medium Density)
pins: 1 NC_1, 2 NC_2, 3 CATHODE, 4 REF, 5 ANODE

## TLV431AIDBZRG4
designator U?
Integrated Circuit; Manufacturer_Name: Texas Instruments; Manufacturer_Part_Number: TLV431AIDBZRG4; Datasheet Link: http://www.ti.com/lit/ds/symlink/tlv431a.pdf; Height: 1.12mm; Mouser Part Number: 595-TLV431AIDBZRG4; Mouser Price/Stock: https://www.mouser.com/Search/Refine.aspx?Keyword=595-TLV431AIDBZRG4
footprint SOT23-3 (贴片MOS的SOT-23封装)
pins: 1 REF, 2 CATHODE, 3 ANODE

## TLV1117-33CDCYR
designator U?
Integrated Circuit; Manufacturer_Name: Texas Instruments; Manufacturer_Part_Number: TLV1117-33CDCYR; Datasheet Link: http://www.ti.com/lit/gpn/tlv1117; Height: 1.8mm; Mouser Part Number: 595-TLV1117-33CDCYR; Mouser Price/Stock: https://www.mouser.com/Search/Refine.aspx?Keyword=595-TLV1117-33CDCYR
footprint SOT223
pins: 1 ADJ/GND, 2 OUTPUT_1, 3 INPUT, 4 OUTPUT_2

## TLV2252AID
designator U?
Integrated Circuit; Manufacturer_Name: Texas Instruments; Manufacturer_Part_Number: TLV2252AID; Datasheet Link: http://www.ti.com/lit/ds/symlink/tlv2252a.pdf; Height: 1.75mm; Mouser Part Number: 595-TLV2252AID; RS Part Number: 3568717; RS Price/Stock: http://uk.rs-online.com/web/p/products/3568717
footprint SOIC8_1.27 (SOP, 8-Leads, Pitch 1.27mm)
pins: 1 1OUT (out), 2 1IN- (in), 3 1IN+ (in), 4 VDD-/GND (power), 5 2IN+ (in), 6 2IN- (in), 7 2OUT (out), 8 VDD+ (power)